# Altium footprint library connectors_socets.pcblib: 567 footprints (part 35 of 36)
Each footprint in its own frame and in the unit in brackets; x right, y up, seen from the top. Pads: shape width x height; smd on the part's side, far side on the other; paste and mask are expansions set on the pad; w line width, h text height; cw(c..) or ccw(c..) is an arc to the next point about the centre after c.
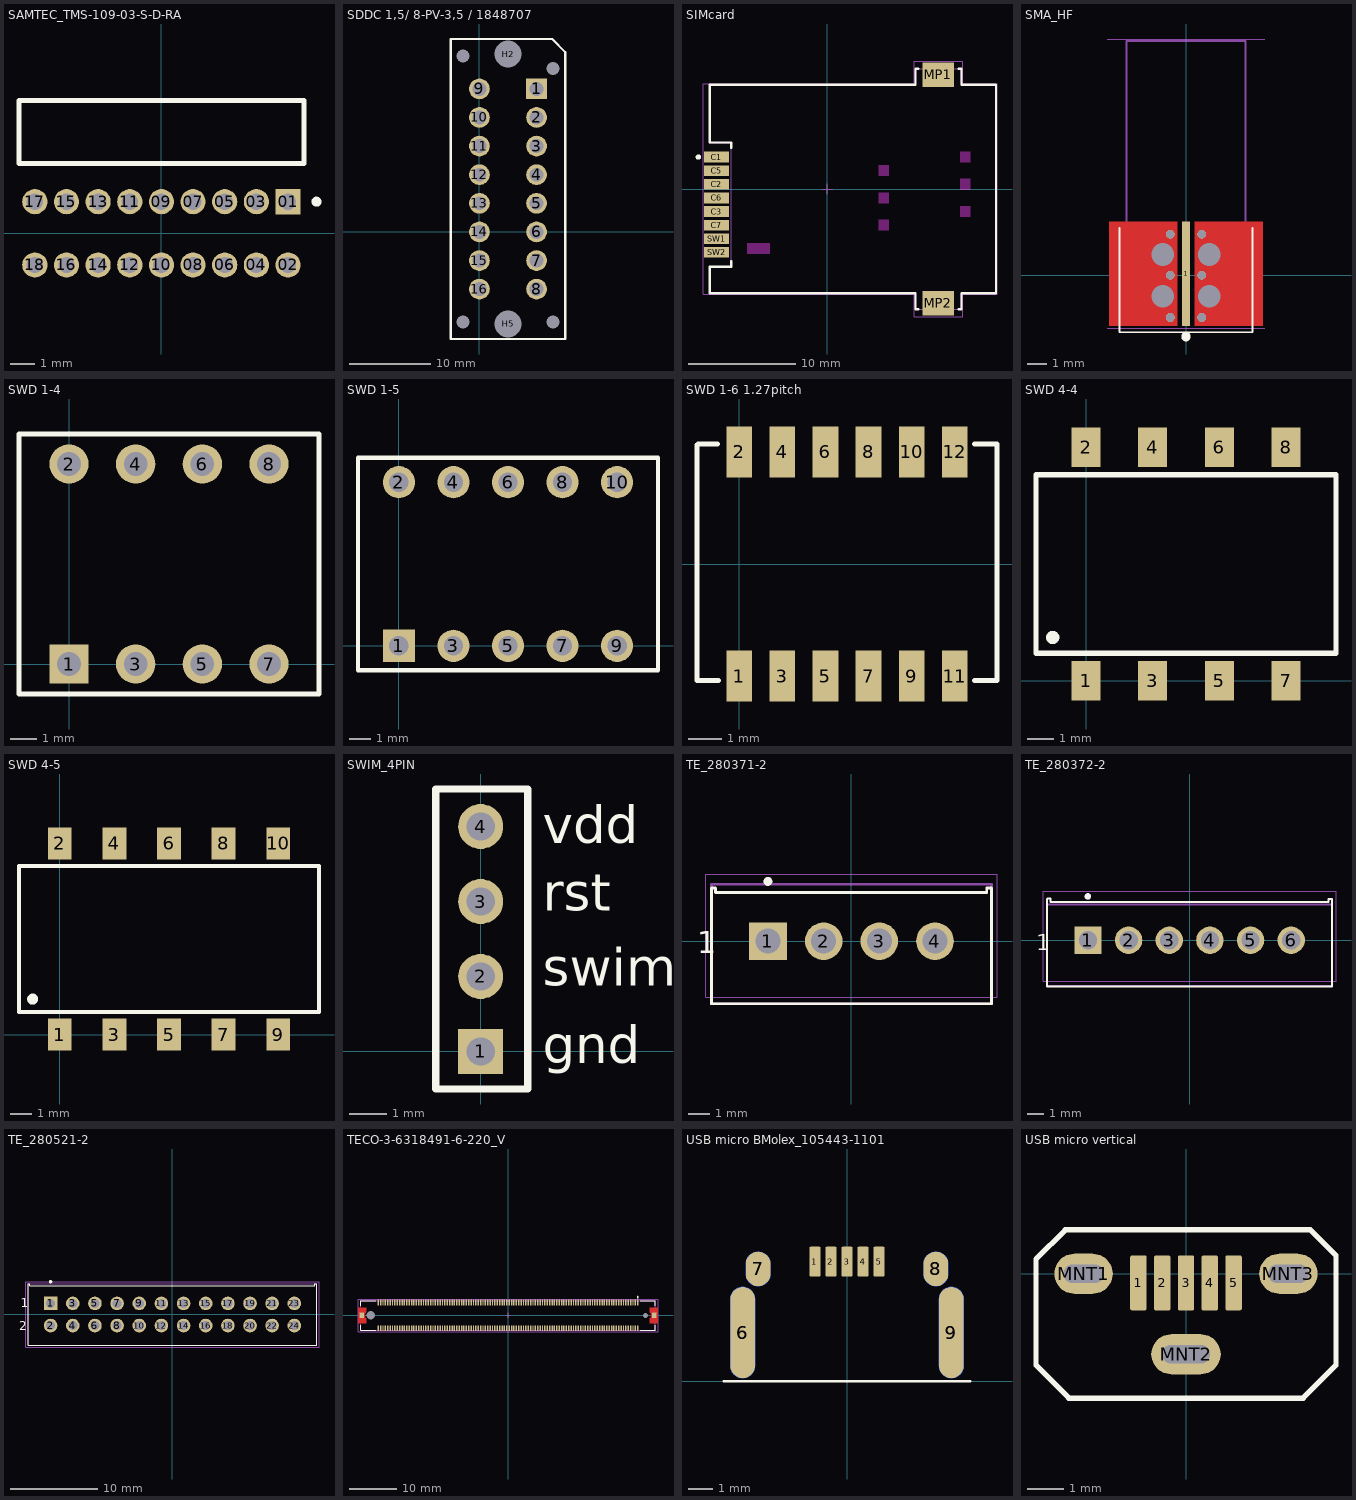
[diagram p34: the footprints below, top view; thin cyan lines are the x and y axes]

## SAMTEC_TMS-109-03-S-D-RA [mm]
pads (18):
  rect 1.01x1.01 hole 0.66: 01(5.08,1.27)
  round 1.01 hole 0.66: 02(5.08,-1.27) 03(3.81,1.27) 04(3.81,-1.27) 05(2.54,1.27) 06(2.54,-1.27) 07(1.27,1.27) 08(1.27,-1.27) 09(0,1.27) 10(0,-1.27) 11(-1.27,1.27) 12(-1.27,-1.27) 13(-2.54,1.27) 14(-2.54,-1.27) 15(-3.81,1.27) 16(-3.81,-1.27) 17(-5.08,1.27) 18(-5.08,-1.27)
Top Overlay:
  circle w0.2: c6.223,1.27 r0.1
  lines w0.2: -5.715,2.794 -5.715,5.334 5.715,5.334 5.715,2.794 -5.715,2.794
3D body "TMS-109-03-S-D-RA.stp": height 5.05, standoff -3.49, extent -5.715,-1.518 5.715,8.515

## SDDC 1,5/ 8-PV-3,5 / 1848707 [mm] "Direct PCB connector"
pads (22):
  rect 2.535x2.535 hole 1.69: 1(7,17.5)
  round 2.535 hole 1.69: 2(7,14) 3(7,10.5) 4(7,7) 5(7,3.5) 6(7,0) 7(7,-3.5) 8(7,-7) 9(0,17.5) 10(0,14) 11(0,10.5) 12(0,7) 13(0,3.5) 14(0,0) 15(0,-3.5) 16(0,-7)
  round 0.8 hole 1.6 unplated: H1(-2,21.5) H3(9,20) H4(-2,-11) H6(9,-11)
  round 1.65 hole 3.3 unplated: H2(3.5,21.75) H5(3.5,-11.25)
Top Overlay:
  lines w0.254: -3.5,-13.1 10.5,-13.1 10.5,22 8.9,23.6 -3.5,23.6 -3.5,-13.1
3D body "pxc_1848707_01_SDDC-1-5-8-PV-3-5_3D.stp": height 14.1, standoff -3.5, extent -3.25,-12.9 10.25,23.4

## SIMcard [mm]
pads (10):
  rect 2.3x1 smd: C1(-10.35,2.98) C2(-10.35,0.44) C3(-10.35,-2.1) C5(-10.35,1.71) C6(-10.35,-0.83) C7(-10.35,-3.37) SW1(-10.35,-4.64) SW2(-10.35,-5.91)
  rect 2.95x2.3 smd: MP1(10.35,10.675) MP2(10.35,-10.675)
Top Layer keep-out:
  rectangle: 12.35,2.46 13.35,3.5
  rectangle: 12.35,-0.08 13.35,0.96
  rectangle: 12.35,-2.62 13.35,-1.58
  rectangle: 4.75,1.19 5.75,2.23
  rectangle: 4.75,-3.89 5.75,-2.85
  rectangle: 4.75,-1.35 5.75,-0.31
  rectangle: -7.5,-6.06 -5.35,-5.02
Top Overlay:
  circle w0.25: c-12.05,2.98 r0.125
  lines w0.2: -8.985,-6.747 -8.985,-7.255 -10.985,-7.255 -10.985,-9.725 8.2,-9.725 ; -8.985,3.817 -8.985,4.325 -10.985,4.325 -10.985,9.725 8.2,9.725 ; 8.2,-9.725 8.2,-11.225 8.475,-11.225 ; 8.2,9.725 8.2,11.225 8.475,11.225 ; 12.225,-11.225 12.5,-11.225 12.5,-9.725 15.715,-9.725 15.715,9.725 12.5,9.725 12.5,11.225 12.225,11.225
Plata3D:
  lines w0.1: 8.199,-11.225 8.199,-9.725 ; 8.2,-11.225 12.5,-11.225 12.5,-9.725 15.715,-9.725 15.715,9.725 12.5,9.725 12.5,11.225 8.2,11.225 8.2,9.725 -10.985,9.725 -10.985,4.325 -8.985,4.325 -8.985,-7.255 -10.985,-7.255 -10.985,-9.725 8.201,-9.725
Board3D:
  lines w0.05: -11.6,-9.825 -11.6,9.825 8.1,9.825 8.1,11.925 12.6,11.925 12.6,9.825 15.815,9.825 15.815,-9.825 12.6,-9.825 12.6,-11.925 8.1,-11.925 8.1,-9.825 -11.6,-9.825
  lines w0.1: -0.5,0 0.5,0 ; 0,-0.5 0,0.5
3D body: height 1.5, standoff 1.05, extent 9.388,-11.229 11.294,-10.478
3D body: height 1.5, standoff 1.05, extent 9.376,10.479 11.282,11.23
3D body: height 1.4, standoff 1, extent 4.724,-3.861 5.766,-2.87
3D body: height 1.4, standoff 1, extent 12.324,-0.051 13.366,0.94
3D body: height 1.4, standoff 1, extent 4.724,-1.321 5.766,-0.33
3D body: height 1.4, standoff 1, extent 4.724,1.219 5.766,2.21
3D body: height 1.4, standoff 1, extent 12.324,-2.591 13.366,-1.6
3D body: height 1.4, standoff 1, extent 12.324,2.489 13.366,3.48
3D body: height 2.4, standoff 0.2, extent -10.985,-9.725 15.715,9.725
3D body: height 1.5, standoff 1.05, extent 13.717,-9.166 15.751,4.168
3D body: height 2.4, standoff 0, extent 8.191,-10.473 12.49,-6.574
3D body: height 2.4, standoff 0, extent 8.179,6.575 12.478,10.474
3D body: height 2.4, standoff 0, extent 9.195,7.057 11.607,7.945
3D body: height 2.4, standoff 0, extent 9.206,-7.944 11.618,-7.056
3D body: height 0.2, standoff 0, extent -8.126,-3.899 -0.127,4.1
3D body: height 0.77, standoff -0.01, extent -11.112,-6.21 -8.952,-5.61
3D body: height 0.77, standoff -0.01, extent -11.112,-4.94 -8.952,-4.34
3D body: height 0.77, standoff -0.01, extent -11.112,-3.67 -8.952,-3.07
3D body: height 0.77, standoff -0.01, extent -11.112,-2.4 -8.952,-1.8
3D body: height 0.77, standoff -0.01, extent -11.112,-1.13 -8.952,-0.53
3D body: height 0.77, standoff -0.01, extent -11.112,0.14 -8.952,0.74
3D body: height 0.77, standoff -0.01, extent -11.112,1.41 -8.952,2.01
3D body: height 0.77, standoff -0.01, extent -11.112,2.68 -8.952,3.28

## SMA_HF [mil] "142-0761-881"
pads (5):
  rect 16x218 smd: 1(0,3.46)
  round 0 hole 47: 2(-48,43.5) 3(48,43.5) 4(-48,-43.5) 5(48,-43.5)
via 33,-87.5 diameter 18 hole 18
via -33,-87.5 diameter 18 hole 18
via -33,85.5 diameter 18 hole 18
via 33,85.5 diameter 18 hole 18
via -33,0.5 diameter 18 hole 18
via 33,0.5 diameter 18 hole 18
Top Layer:
  region: -18,112.5 -160,112.5 -160,-105.5 -18,-105.5
  rectangle: 18,-105.55 160,112.46
Top Overlay:
  circle w9.84: c0,-127.2 r4.92
  lines w3.94: -137.8,98.43 -137.8,-118.11 137.8,-118.11 137.8,98.43
Plata3D:
  lines w3.94: -123.5,98.43 -123.5,487.31 123.5,487.31 123.5,98.43
Board3D:
  lines w1.97: -163.94,-109.49 163.94,-109.49 ; -163.94,491.26 163.94,491.26
3D body "shenma.STEP": height 128.43, standoff -118.43, extent -123.42,-66.49 123.43,487.31

## SWD 1-4 [mm]
height 0.001
pads (8):
  rect 1.5x1.5 hole 0.9: 1(0,0)
  round 1.5 hole 0.9: 2(0,7.62) 3(2.54,0) 4(2.54,7.62) 5(5.08,0) 6(5.08,7.62) 7(7.62,0) 8(7.62,7.62)
Top Overlay:
  lines w0.2: -1.905,-1.14 -1.905,8.76 9.525,8.76 9.525,-1.14 -1.905,-1.14
3D body "SWD1-4.step": height 7, standoff -3.7, extent -1.77,-1.14 9.39,8.76

## SWD 1-5 [mm]
height 0.001
pads (10):
  rect 1.5x1.5 hole 0.9: 1(0,0)
  round 1.5 hole 0.9: 2(0,7.62) 3(2.54,0) 4(2.54,7.62) 5(5.08,0) 6(5.08,7.62) 7(7.62,0) 8(7.62,7.62) 9(10.16,0) 10(10.16,7.62)
Top Overlay:
  lines w0.2: -1.905,-1.14 12.065,-1.14 12.065,8.76 -1.905,8.76 -1.905,-1.14
3D body "SWD1-5.step": height 7, standoff -3.7, extent -1.778,-1.14 11.922,8.76

## SWD 1-6 1.27pitch [mm]
height 0.001
pads (12):
  rect 0.76x1.5 smd: 1(0,-3.3) 2(0,3.3) 3(1.27,-3.3) 4(1.27,3.3) 5(2.54,-3.3) 6(2.54,3.3) 7(3.81,-3.3) 8(3.81,3.3) 9(5.08,-3.3) 10(5.08,3.3) 11(6.35,-3.3) 12(6.35,3.3)
Top Overlay:
  lines w0.15: -0.635,3.531 -1.219,3.531 -1.245,3.505 -1.245,-3.429 -0.61,-3.429 ; 6.934,-3.429 7.595,-3.429 7.595,3.531 6.934,3.531
3D body "DIP-6.stp": height 1.5, standoff 0, extent -1.25,-3.454 7.6,3.528

## SWD 4-4 [mm]
height 0.001
pads (8):
  rect 1.1x1.5 smd: 1(0,0) 2(0,8.9) 3(2.54,0) 4(2.54,8.9) 5(5.08,0) 6(5.08,8.9) 7(7.62,0) 8(7.62,8.9)
Top Overlay:
  circle w0.254: c-1.27,1.651 r0.127
  lines w0.2: -1.905,1.05 9.525,1.05 9.525,7.85 -1.905,7.85 -1.905,1.05
3D body "SWD4-4e.stp": height 4.4, standoff 0, extent -1.74,-0.455 9.36,9.345

## SWD 4-5 [mm]
height 0.001
pads (10):
  rect 1.1x1.5 smd: 1(0,0) 2(0,8.9) 3(2.54,0) 4(2.54,8.9) 5(5.08,0) 6(5.08,8.9) 7(7.62,0) 8(7.62,8.9) 9(10.16,0) 10(10.16,8.9)
Top Overlay:
  circle w0.254: c-1.27,1.651 r0.127
  lines w0.2: -1.905,1.05 -1.905,7.85 12.065,7.85 12.065,1.05 -1.905,1.05
3D body "SWD4-5e.stp": height 4.4, standoff 0, extent -1.74,-0.455 11.9,9.345

## SWIM_4PIN [mm] "Connector; Header; 1x4 Position"
height 6
pads (4):
  rect 1.2x1.2 hole 0.75: 1(0,0)
  round 1.2 hole 0.75: 2(0,2) 3(0,4) 4(0,6)
Top Overlay:
  lines w0.2: -1.2,-1 -1.2,7 1.25,7 1.25,-1 -1.2,-1
  text "gnd" at 1.654,-0.313 h1
  text "swim" at 1.654,1.754 h1
  text "rst" at 1.654,3.754 h1
  text "vdd" at 1.654,5.554 h1
3D body "pls-2mm.stp": height 5.5, standoff -2.5, extent -1.2,-1 1.2,1
3D body "pls-2mm.stp": height 5.5, standoff -2.5, extent -1.2,1 1.2,3
3D body "pls-2mm.stp": height 5.5, standoff -2.5, extent -1.2,3 1.2,5
3D body "pls-2mm.stp": height 5.5, standoff -2.5, extent -1.2,5 1.2,7

## TE_280371-2 [mil]
pads (4):
  rect 67.5x67.5 hole 45: 1(-150,0)
  round 67.5 hole 45: 2(-50,0) 3(50,0) 4(150,0)
Top Overlay:
  circle w7.87: c-150,107.28 r3.94
  lines w5: -244.09,87.6 243.11,87.6 243.11,95.47 251.57,95.47 251.57,-112.2 -251.57,-112.2 -251.57,95.47 -244.09,95.47 -244.09,87.6 ; -244.09,87.6 -244.09,87.6
  text "1" at -277.48,-21.57 h39.37
Plata3D:
  circle w7.87: c-150,107.28 r3.94
  lines w5: -251.57,-112.2 251.57,-112.2 251.57,102.36 -251.57,102.36 -251.57,-112.2
Board3D:
  lines w1.97: -261.42,-100.39 -261.42,120.08 261.42,120.08 261.42,-100.39 -261.42,-100.39
3D body "280371-2.stp": height 496.56, standoff -137.3, extent -245.08,-105.91 245.08,90.95

## TE_280372-2 [mil] "Straight PCB Header, 6-Way 1 Row, 2.54 mm Pitch, Solder, AMPMODU Mod II Series"
pads (6):
  rect 67.5x67.5 hole 45: 1(-250,0)
  round 67.5 hole 45: 2(-150,0) 3(-50,0) 4(50,0) 5(150,0) 6(250,0)
Top Overlay:
  circle w7.87: c-250.38,107.85 r3.94
  lines w5: -350.39,101.38 -350.39,-114.17 350.39,-114.17 350.39,101.38 341.93,101.38 341.93,94.49 -342.52,94.49 ; -350,102.36 -342.52,102.36 -342.52,94.49 ; -342.52,94.49 -342.52,94.49
  text "1" at -377.87,-24.53 h39.37
Plata3D:
  circle w7.87: c-250.38,107.85 r3.94
  lines w5: -350.39,-113.19 350.39,-113.19 350.39,87.6 -350.39,87.6 -350.39,-113.19
Board3D:
  lines w1.97: -360.24,-100.39 -360.24,120.08 360.24,120.08 360.24,-100.39 -360.24,-100.39
3D body "280372-2.stp": height 496.56, standoff -137.3, extent -345.08,-109.45 345.08,87.4

## TE_280521-2 [mm]
pads (24):
  rect 1.56x1.56 hole 1.04: 1(-13.97,1.27)
  round 1.56 hole 1.04: 2(-13.97,-1.27) 3(-11.43,1.27) 4(-11.43,-1.27) 5(-8.89,1.27) 6(-8.89,-1.27) 7(-6.35,1.27) 8(-6.35,-1.27) 9(-3.81,1.27) 10(-3.81,-1.27) 11(-1.27,1.27) 12(-1.27,-1.27) 13(1.27,1.27) 14(1.27,-1.27) 15(3.81,1.27) 16(3.81,-1.27) 17(6.35,1.27) 18(6.35,-1.27) 19(8.89,1.27) 20(8.89,-1.27) 21(11.43,1.27) 22(11.43,-1.27) 23(13.97,1.27) 24(13.97,-1.27)
Top Overlay:
  lines w0.127: -16.55,3.5 -16.55,-3.55 16.55,-3.55 16.55,3.5 16.335,3.5 16.335,3.325 ; -16.54,3.5 -16.35,3.5 -16.35,3.3 ; 16.335,3.3 -16.35,3.3 ; -16.35,3.3 -16.35,3.3
  lines w0.2: -13.917,3.835 ccw(c-13.975,3.75) -13.913,3.832
  text "2" at -17.598,-1.823 h1
  text "1" at -17.398,0.827 h1
Plata3D:
  lines w0.127: -16.55,-3.55 -16.55,3.5 16.55,3.5 16.55,-3.55 -16.55,-3.55
Board3D:
  lines w0.05: -16.8,-3.75 16.8,-3.75 16.8,3.75 -16.8,3.75 -16.8,-3.75
3D body "280521-2.stp": height 12.61, standoff -3.49, extent -16.385,-3.5 16.385,3.5

## TECO-3-6318491-6-220_V [mm] "CONN, 220-Leads, Body 61.8x6.2mm, Pitch 0.5mm"
height 7.45
pads (224):
  rect 0.3x1.2 smd: 1(27.25,2.7) 2(27.25,-2.7) 3(26.75,2.7) 4(26.75,-2.7) 5(26.25,2.7) 6(26.25,-2.7) 7(25.75,2.7) 8(25.75,-2.7) 9(25.25,2.7) 10(25.25,-2.7) 11(24.75,2.7) 12(24.75,-2.7) 13(24.25,2.7) 14(24.25,-2.7) 15(23.75,2.7) 16(23.75,-2.7) 17(23.25,2.7) 18(23.25,-2.7) 19(22.75,2.7) 20(22.75,-2.7) 21(22.25,2.7) 22(22.25,-2.7) 23(21.75,2.7) 24(21.75,-2.7) 25(21.25,2.7) 26(21.25,-2.7) 27(20.75,2.7) 28(20.75,-2.7) 29(20.25,2.7) 30(20.25,-2.7) 31(19.75,2.7) 32(19.75,-2.7) 33(19.25,2.7) 34(19.25,-2.7) 35(18.75,2.7) 36(18.75,-2.7) 37(18.25,2.7) 38(18.25,-2.7) 39(17.75,2.7) 40(17.75,-2.7) 41(17.25,2.7) 42(17.25,-2.7) 43(16.75,2.7) 44(16.75,-2.7) 45(16.25,2.7) 46(16.25,-2.7) 47(15.75,2.7) 48(15.75,-2.7) 49(15.25,2.7) 50(15.25,-2.7) 51(14.75,2.7) 52(14.75,-2.7) 53(14.25,2.7) 54(14.25,-2.7) 55(13.75,2.7) 56(13.75,-2.7) 57(13.25,2.7) 58(13.25,-2.7) 59(12.75,2.7) 60(12.75,-2.7) 61(12.25,2.7) 62(12.25,-2.7) 63(11.75,2.7) 64(11.75,-2.7) 65(11.25,2.7) 66(11.25,-2.7) 67(10.75,2.7) 68(10.75,-2.7) 69(10.25,2.7) 70(10.25,-2.7) 71(9.75,2.7) 72(9.75,-2.7) 73(9.25,2.7) 74(9.25,-2.7) 75(8.75,2.7) 76(8.75,-2.7) 77(8.25,2.7) 78(8.25,-2.7) 79(7.75,2.7) 80(7.75,-2.7) 81(7.25,2.7) 82(7.25,-2.7) 83(6.75,2.7) 84(6.75,-2.7) 85(6.25,2.7) 86(6.25,-2.7) 87(5.75,2.7) 88(5.75,-2.7) 89(5.25,2.7) 90(5.25,-2.7) 91(4.75,2.7) 92(4.75,-2.7) 93(4.25,2.7) 94(4.25,-2.7) 95(3.75,2.7) 96(3.75,-2.7) 97(3.25,2.7) 98(3.25,-2.7) 99(2.75,2.7) 100(2.75,-2.7) 101(2.25,2.7) 102(2.25,-2.7) 103(1.75,2.7) 104(1.75,-2.7) 105(1.25,2.7) 106(1.25,-2.7) 107(0.75,2.7) 108(0.75,-2.7) 109(0.25,2.7) 110(0.25,-2.7) 111(-0.25,2.7) 112(-0.25,-2.7) 113(-0.75,2.7) 114(-0.75,-2.7) 115(-1.25,2.7) 116(-1.25,-2.7) 117(-1.75,2.7) 118(-1.75,-2.7) 119(-2.25,2.7) 120(-2.25,-2.7) 121(-2.75,2.7) 122(-2.75,-2.7) 123(-3.25,2.7) 124(-3.25,-2.7) 125(-3.75,2.7) 126(-3.75,-2.7) 127(-4.25,2.7) 128(-4.25,-2.7) 129(-4.75,2.7) 130(-4.75,-2.7) 131(-5.25,2.7) 132(-5.25,-2.7) 133(-5.75,2.7) 134(-5.75,-2.7) 135(-6.25,2.7) 136(-6.25,-2.7) 137(-6.75,2.7) 138(-6.75,-2.7) 139(-7.25,2.7) 140(-7.25,-2.7) 141(-7.75,2.7) 142(-7.75,-2.7) 143(-8.25,2.7) 144(-8.25,-2.7) 145(-8.75,2.7) 146(-8.75,-2.7) 147(-9.25,2.7) 148(-9.25,-2.7) 149(-9.75,2.7) 150(-9.75,-2.7) 151(-10.25,2.7) 152(-10.25,-2.7) 153(-10.75,2.7) 154(-10.75,-2.7) 155(-11.25,2.7) 156(-11.25,-2.7) 157(-11.75,2.7) 158(-11.75,-2.7) 159(-12.25,2.7) 160(-12.25,-2.7) 161(-12.75,2.7) 162(-12.75,-2.7) 163(-13.25,2.7) 164(-13.25,-2.7) 165(-13.75,2.7) 166(-13.75,-2.7) 167(-14.25,2.7) 168(-14.25,-2.7) 169(-14.75,2.7) 170(-14.75,-2.7) 171(-15.25,2.7) 172(-15.25,-2.7) 173(-15.75,2.7) 174(-15.75,-2.7) 175(-16.25,2.7) 176(-16.25,-2.7) 177(-16.75,2.7) 178(-16.75,-2.7) 179(-17.25,2.7) 180(-17.25,-2.7) 181(-17.75,2.7) 182(-17.75,-2.7) 183(-18.25,2.7) 184(-18.25,-2.7) 185(-18.75,2.7) 186(-18.75,-2.7) 187(-19.25,2.7) 188(-19.25,-2.7) 189(-19.75,2.7) 190(-19.75,-2.7) 191(-20.25,2.7) 192(-20.25,-2.7) 193(-20.75,2.7) 194(-20.75,-2.7) 195(-21.25,2.7) 196(-21.25,-2.7) 197(-21.75,2.7) 198(-21.75,-2.7) 199(-22.25,2.7) 200(-22.25,-2.7) 201(-22.75,2.7) 202(-22.75,-2.7) 203(-23.25,2.7) 204(-23.25,-2.7) 205(-23.75,2.7) 206(-23.75,-2.7) 207(-24.25,2.7) 208(-24.25,-2.7) 209(-24.75,2.7) 210(-24.75,-2.7) 211(-25.25,2.7) 212(-25.25,-2.7) 213(-25.75,2.7) 214(-25.75,-2.7) 215(-26.25,2.7) 216(-26.25,-2.7) 217(-26.75,2.7) 218(-26.75,-2.7) 219(-27.25,2.7) 220(-27.25,-2.7)
  round 0 hole 1.05 unplated: MH1(28.85,0)
  round 0 hole 1.75 unplated: MH2(-28.85,0)
  rect 1x1.2 smd: MP1(30.725,0) MP2(-30.725,0)
Top Layer:
  region: 31.4,1.65 31.4,-1.65 29.75,-1.65 29.75,-0.73 29.818,-0.655 29.93,-0.487 30.008,-0.3 30.047,-0.101 30.047,0.101 30.008,0.3 29.93,0.487 29.818,0.655 29.75,0.73 29.75,1.65
  region: -31.4,-1.65 -31.4,1.65 -29.75,1.65 -29.75,0.73 -29.818,0.655 -29.93,0.487 -30.008,0.3 -30.047,0.101 -30.047,-0.101 -30.008,-0.3 -29.93,-0.487 -29.818,-0.655 -29.75,-0.73 -29.75,-1.65
Top Overlay:
  circle w0.25: c27.25,3.85 r0.125
  lines w0.2: -30.9,-2.05 -30.9,-3.1 -27.8,-3.1 ; -30.9,2.05 -30.9,3.1 -27.8,3.1 ; 27.8,-3.1 30.9,-3.1 30.9,-2.05 ; 27.8,3.1 30.9,3.1 30.9,2.05
Plata3D:
  lines w0.1: -30.9,-3.1 30.9,-3.1 30.9,3.1 -30.9,3.1 -30.9,-3.1
Board3D:
  lines w0.05: -31.5,-3.4 31.5,-3.4 31.5,3.4 -31.5,3.4 -31.5,-3.4
  lines w0.1: -0.5,0 0.5,0 ; 0,-0.5 0,0.5
3D body "c-3-6318491-6-c1-3d.stp": height 7.45, standoff -0.6, extent -30.9,-3.1 30.9,3.1

## USB micro BMolex_105443-1101 [mm] "105443-1101"
pads (13):
  rrect20% 0.45x1.2 smd mask+0.05: 1(-1.3,4.85) 2(-0.65,4.85) 3(0,4.85) 4(0.65,4.85) 5(1.3,4.85)
  oval 1x3.7 smd mask+0.05: 6(-4.225,1.975) 9(4.225,1.975)
  oval 1x3.7 smd far side mask+0.05: 6(-4.225,1.975) 9(4.225,1.975)
  oval 1x1.4 smd mask+0.05: 7(-3.6,4.55) 8(3.6,4.55)
  oval 1x1.4 smd far side mask+0.05: 7(-3.6,4.55) 8(3.6,4.55)
Top Overlay:
  lines w0.1: -5,0 5,0
Board:
  lines w0.01: -4.475,0.75 ccw(c-4.225,0.75) -3.975,0.75 -3.975,1.45 ccw(c-4.225,1.45) -4.475,1.45 -4.475,0.75 ; -4.475,2.5 ccw(c-4.225,2.5) -3.975,2.5 -3.975,3.2 ccw(c-4.225,3.2) -4.475,3.2 -4.475,2.5 ; -3.9,4.35 ccw(c-3.6,4.35) -3.3,4.35 -3.3,4.75 ccw(c-3.6,4.75) -3.9,4.75 -3.9,4.35 ; 3.3,4.35 ccw(c3.6,4.35) 3.9,4.35 3.9,4.75 ccw(c3.6,4.75) 3.3,4.75 3.3,4.35 ; 3.975,0.75 ccw(c4.225,0.75) 4.475,0.75 4.475,1.45 ccw(c4.225,1.45) 3.975,1.45 3.975,0.75 ; 3.975,2.5 ccw(c4.225,2.5) 4.475,2.5 4.475,3.2 ccw(c4.225,3.2) 3.975,3.2 3.975,2.5
Mechanical 10:
  text ".Designator" at 0,15.55 h1
3D body "User Library-molex-105443-1101-USB.step": height 4.5, standoff -0.8, extent -4.7,-1.8 4.7,5.25

## USB micro vertical [mm] "1051330011"
pads (8):
  rrect20% 0.45x1.5 smd mask+0.05: 1(-1.3,-0.25) 2(-0.65,-0.25) 3(0,-0.25) 4(0.65,-0.25) 5(1.3,-0.25)
  oval 1.6x1.1 hole 0.5 slot 1.1 at 0 deg unplated mask+0.05: MNT1(-2.8,0) MNT3(2.8,0)
  oval 1.9x1.1 hole 0.5 slot 1.3 at 0 deg unplated mask+0.05: MNT2(0,-2.2)
Top Overlay:
  lines w0.15: -4.1,-2.5 -4.1,0.4 -3.3,1.2 3.4,1.2 4.1,0.5 4.1,-2.5 3.2,-3.4 -3.2,-3.4 -4.1,-2.5
Mechanical 10:
  text ".Designator" at 0,15.55 h1
3D body "1051330011.stp": height 7.53, standoff -2.27, extent -4.025,-3.35 4,1.1